# Altium footprint library kalios.PcbLib: 404 footprints (part 10 of 26) (continued)
## LOGO/EPFL/TOP+SMT/20x5.62mm [mm]
Top Layer:
  region: 6.452,2.327 6.445,2.793 6.452,2.88
  region: 6.452,2.327 6.452,2.88 6.481,2.013
  region: 6.481,2.013 6.452,2.88 6.481,3.294
  region: 6.481,2.013 6.481,3.294 6.492,1.896
  region: 6.492,1.896 6.481,3.294 6.492,3.363
  region: 6.492,1.896 6.492,3.363 6.56,1.502
  region: 6.56,1.502 6.492,3.363 6.56,3.788
  region: 6.56,1.502 6.56,3.788 6.566,1.481
  region: 6.566,1.481 6.56,3.788 6.566,3.826
  region: 6.566,1.481 6.566,3.826 6.707,0.975
  region: 6.707,0.975 6.566,3.826 6.707,4.388
  region: 6.707,0.975 6.707,4.388 6.746,0.835
  region: 6.746,0.835 6.707,4.388 6.746,4.501
  region: 6.746,0.835 6.746,4.501 6.912,0.437
  region: 6.912,0.437 6.746,4.501 6.912,4.979
  region: 6.912,0.437 6.912,4.979 6.953,0.34
  region: 6.953,0.34 6.912,4.979 6.953,5.069
  region: 6.953,0.34 6.953,5.069 7.084,0.098
  region: 7.084,0.098 6.953,5.069 7.084,5.361
  region: 7.084,0.098 7.084,2.498 7.089,0.09
  region: 7.089,0.09 7.084,2.498 7.089,2.287
  region: 7.084,2.498 7.084,5.361 7.089,2.498
  region: 7.089,2.498 7.084,5.361 7.089,5.372
  region: 7.089,0.09 7.089,2.287 7.112,0.046
  region: 7.112,0.046 7.089,2.287 7.112,2.107
  region: 7.089,2.498 7.089,5.372 7.112,2.498
  region: 7.112,2.498 7.089,5.372 7.112,5.424
  region: 7.112,0.046 7.112,2.107 7.12,0.031
  region: 7.12,0.031 7.112,2.107 7.12,2.046
  region: 7.112,2.498 7.112,3.086 7.12,2.498
  region: 7.12,2.498 7.112,3.086 7.12,3.086
  region: 7.112,3.086 7.112,5.424 7.12,3.174
  region: 7.12,3.174 7.112,5.424 7.12,5.442
  region: 7.12,0.031 7.12,2.046 7.153,-0.019
  region: 7.153,-0.019 7.12,2.046 7.153,1.793
  region: 7.12,2.498 7.12,3.086 7.153,2.498
  region: 7.153,2.498 7.12,3.086 7.153,3.086
  region: 7.12,3.174 7.12,5.442 7.153,3.543
  region: 7.153,3.543 7.12,5.442 7.153,5.516
  region: 7.153,-0.019 7.153,1.793 7.163,-0.034
  region: 7.163,-0.034 7.153,1.793 7.163,1.721
  region: 7.153,2.498 7.153,3.086 7.163,2.498
  region: 7.163,2.498 7.153,3.086 7.163,3.086
  region: 7.153,3.543 7.153,5.516 7.163,3.589
  region: 7.163,3.589 7.153,5.516 7.163,5.537
  region: 7.163,-0.034 7.163,1.721 7.189,-0.074
  region: 7.189,-0.074 7.163,1.721 7.189,1.609
  region: 7.163,2.498 7.163,3.086 7.189,2.498
  region: 7.189,2.498 7.163,3.086 7.189,3.086
  region: 7.163,3.589 7.163,5.537 7.189,3.719
  region: 7.189,3.719 7.163,5.537 7.189,5.596
  region: 7.189,-0.074 7.189,1.609 7.244,-0.074
  region: 7.244,-0.074 7.189,1.609 7.244,1.377
  region: 7.189,2.498 7.189,3.086 7.244,2.498
  region: 7.244,2.498 7.189,3.086 7.244,3.086
  region: 7.189,3.719 7.189,5.596 7.244,3.991
  region: 7.244,3.991 7.189,5.596 7.244,5.596
  region: 7.244,-0.074 7.244,1.377 7.254,-0.074
  region: 7.254,-0.074 7.244,1.377 7.254,1.336
  region: 7.244,2.498 7.244,3.086 7.254,2.498
  region: 7.254,2.498 7.244,3.086 7.254,3.086
  region: 7.244,3.991 7.244,5.596 7.254,4.021
  region: 7.254,4.021 7.244,5.596 7.254,5.596
  region: 7.254,-0.074 7.254,1.336 7.397,-0.074
  region: 7.397,-0.074 7.254,1.336 7.397,0.9
  region: 7.254,2.498 7.254,3.086 7.397,2.498
  region: 7.397,2.498 7.254,3.086 7.397,3.086
  region: 7.254,4.021 7.254,5.596 7.397,4.459
  region: 7.397,4.459 7.254,5.596 7.397,5.596
  region: 7.397,-0.074 7.397,0.9 7.507,-0.074
  region: 7.507,-0.074 7.397,0.9 7.507,0.645
  region: 7.397,2.498 7.397,3.086 7.507,2.498
  region: 7.507,2.498 7.397,3.086 7.507,3.086
  region: 7.397,4.459 7.397,5.596 7.507,4.797
  region: 7.507,4.797 7.397,5.596 7.507,5.596
  region: 7.507,-0.074 7.507,0.645 7.602,-0.074
  region: 7.602,-0.074 7.507,0.645 7.602,0.426
  region: 7.507,2.498 7.507,3.086 7.602,2.498
  region: 7.602,2.498 7.507,3.086 7.602,3.086
  region: 7.507,4.797 7.507,5.596 7.602,5
  region: 7.602,5 7.507,5.596 7.602,5.596
  region: 7.602,-0.074 7.602,0.426 7.797,-0.074
  region: 7.797,-0.074 7.602,0.426 7.797,0.076
  region: 7.602,2.498 7.602,3.086 7.797,2.498
  region: 7.797,2.498 7.602,3.086 7.797,3.086
  region: 7.602,5 7.602,5.596 7.797,5.417
  region: 7.797,5.417 7.602,5.596 7.797,5.596
  region: 7.797,-0.074 7.797,0.076 7.881,-0.074
  region: 7.797,5.417 7.797,5.596 7.881,5.596
  region: 0.076,-0.073 0.076,5.596 5.786,-0.073
  region: 5.786,-0.073 0.076,5.596 5.786,5.596
  region: 5.786,-0.073 5.786,2.794 5.792,-0.073
  region: 5.792,-0.073 5.786,2.794 5.792,2.327
  region: 5.786,2.794 5.786,5.596 5.792,2.879
  region: 5.792,2.879 5.786,5.596 5.792,5.596
  region: 5.792,-0.073 5.792,2.327 5.822,-0.073
  region: 5.822,-0.073 5.792,2.327 5.822,2.013
  region: 5.792,2.879 5.792,5.596 5.822,3.294
  region: 5.822,3.294 5.792,5.596 5.822,5.596
  region: 5.822,-0.073 5.822,2.013 5.833,-0.073
  region: 5.833,-0.073 5.822,2.013 5.833,1.896
  region: 5.822,3.294 5.822,5.596 5.833,3.364
  region: 5.833,3.364 5.822,5.596 5.833,5.596
  region: 5.833,-0.073 5.833,1.896 5.9,-0.073
  region: 5.9,-0.073 5.833,1.896 5.9,1.503
  region: 5.833,3.364 5.833,5.596 5.9,3.788
  region: 5.9,3.788 5.833,5.596 5.9,5.596
  region: 5.9,-0.073 5.9,1.503 5.906,-0.073
  region: 5.906,-0.073 5.9,1.503 5.906,1.481
  region: 5.9,3.788 5.9,5.596 5.906,3.827
  region: 5.906,3.827 5.9,5.596 5.906,5.596
  region: 5.906,-0.073 5.906,1.481 6.048,-0.073
  region: 6.048,-0.073 5.906,1.481 6.048,0.976
  region: 5.906,3.827 5.906,5.596 6.048,4.389
  region: 6.048,4.389 5.906,5.596 6.048,5.596
  region: 6.048,-0.073 6.048,0.976 6.087,-0.073
  region: 6.087,-0.073 6.048,0.976 6.087,0.836
  region: 6.048,4.389 6.048,5.596 6.087,4.502
  region: 6.087,4.502 6.048,5.596 6.087,5.596
  region: 6.087,-0.073 6.087,0.836 6.253,-0.073
  region: 6.253,-0.073 6.087,0.836 6.253,0.438
  region: 6.087,4.502 6.087,5.596 6.253,4.979
  region: 6.253,4.979 6.087,5.596 6.253,5.596
  region: 6.253,-0.073 6.253,0.438 6.293,-0.073
  region: 6.293,-0.073 6.253,0.438 6.293,0.341
  region: 6.253,4.979 6.253,5.596 6.293,5.069
  region: 6.293,5.069 6.253,5.596 6.293,5.596
  region: 6.293,-0.073 6.293,0.341 6.461,-0.073
  region: 6.461,-0.073 6.293,0.341 6.461,0.033
  region: 6.293,5.069 6.293,5.596 6.461,5.442
  region: 6.461,5.442 6.293,5.596 6.461,5.596
  region: 6.461,-0.073 6.461,0.033 6.529,-0.073
  region: 6.461,5.442 6.461,5.596 6.529,5.596
  region: 10.475,-0.075 10.472,2.757 10.475,2.8
  region: 10.475,-0.075 10.475,2.8 10.521,-0.075
  region: 10.521,-0.075 10.475,2.8 10.521,3.395
  region: 10.521,-0.075 10.521,3.395 10.651,-0.075
  region: 10.651,-0.075 10.521,3.395 10.651,4.082
  region: 10.651,-0.075 10.651,4.082 10.878,-0.075
  region: 10.878,-0.075 10.651,4.082 10.878,4.817
  region: 10.878,-0.075 10.878,4.817 11.128,-0.075
  region: 11.128,-0.075 10.878,4.817 11.128,5.391
  region: 11.128,2.497 11.128,5.391 11.139,2.497
  region: 11.139,2.497 11.128,5.391 11.139,5.417
  region: 11.139,2.497 11.139,3.085 11.18,2.497
  region: 11.18,2.497 11.139,3.085 11.18,3.085
  region: 11.139,3.085 11.139,5.417 11.18,3.542
  region: 11.18,3.542 11.139,5.417 11.18,5.512
  region: 11.18,2.497 11.18,3.085 11.217,2.497
  region: 11.217,2.497 11.18,3.085 11.217,3.085
  region: 11.18,3.542 11.18,5.512 11.217,3.721
  region: 11.217,3.721 11.18,5.512 11.217,5.595
  region: 11.217,2.497 11.217,3.085 11.271,2.497
  region: 11.271,2.497 11.217,3.085 11.271,3.085
  region: 11.217,3.721 11.217,5.595 11.271,3.99
  region: 11.271,3.99 11.217,5.595 11.271,5.595
  region: 11.271,2.497 11.271,3.085 11.534,2.497
  region: 11.534,2.497 11.271,3.085 11.534,3.085
  region: 11.271,3.99 11.271,5.595 11.534,4.796
  region: 11.534,4.796 11.271,5.595 11.534,5.595
  region: 11.534,2.497 11.534,3.085 11.825,2.497
  region: 11.825,2.497 11.534,3.085 11.825,3.085
  region: 11.534,4.796 11.534,5.595 11.825,5.416
  region: 11.825,5.416 11.534,5.595 11.825,5.595
  region: 11.825,5.416 11.825,5.595 11.908,5.595
  region: 12.237,2.132 12.217,5.596 12.237,5.596
  region: 12.237,2.132 12.237,5.596 12.317,1.575
  region: 12.317,1.575 12.237,5.596 12.317,5.596
  region: 12.317,1.575 12.317,5.596 12.435,1.09
  region: 12.435,1.09 12.317,5.596 12.435,5.596
  region: 12.435,1.09 12.435,5.596 12.574,0.683
  region: 12.574,0.683 12.435,5.596 12.574,5.596
  region: 12.574,0.683 12.574,5.596 12.715,0.358
  region: 12.715,0.358 12.574,5.596 12.715,5.596
  region: 12.715,0.358 12.715,5.596 12.839,0.12
  region: 12.839,0.12 12.715,5.596 12.839,5.596
  region: 12.839,0.12 12.839,5.596 12.853,0.098
  region: 12.853,0.098 12.839,5.596 12.853,5.596
  region: 12.853,0.098 12.853,5.596 12.856,0.093
  region: 12.856,0.093 12.853,5.596 12.856,2.497
  region: 12.856,0.093 12.856,2.497 12.861,0.085
  region: 12.861,0.085 12.856,2.497 12.861,2.286
  region: 12.861,0.085 12.861,2.286 12.934,-0.034
  region: 12.934,-0.034 12.861,2.286 12.934,1.72
  region: 12.934,-0.034 12.934,1.72 12.961,-0.076
  region: 12.961,-0.076 12.934,1.72 12.961,1.609
  region: 12.961,-0.076 12.961,1.609 13.026,-0.076
  region: 13.026,-0.076 12.961,1.609 13.026,1.334
  region: 13.026,-0.076 13.026,1.334 13.168,-0.076
  region: 13.168,-0.076 13.026,1.334 13.168,0.899
  region: 13.168,-0.076 13.168,0.899 13.374,-0.076
  region: 13.374,-0.076 13.168,0.899 13.374,0.424
  region: 13.374,-0.076 13.374,0.424 13.653,-0.076
  region: 13.526,2.286 13.518,5.596 13.526,5.596
  region: 13.526,2.286 13.526,5.596 13.6,1.72
  region: 13.6,1.72 13.526,5.596 13.6,5.596
  region: 13.6,1.72 13.6,5.596 13.691,1.334
  region: 13.691,1.334 13.6,5.596 13.691,5.596
  region: 13.691,1.334 13.691,5.596 13.834,0.899
  region: 13.834,0.899 13.691,5.596 13.834,5.596
  region: 13.834,0.899 13.834,5.596 14.039,0.424
  region: 14.039,0.424 13.834,5.596 14.039,5.596
  region: 14.039,0.424 14.039,5.596 14.318,-0.076
  region: 14.318,-0.076 14.039,5.596 14.318,5.596
  region: 14.318,-0.076 14.318,5.596 20.071,-0.075
  region: 20.071,-0.075 14.318,5.596 20.071,5.596
  region: 20.071,-0.075 20.071,5.596 20.076,5.596
  region: 8.309,-0.075 8.309,5.596 8.952,-0.075
  region: 8.952,-0.075 8.309,5.596 8.952,5.596
  region: 9.285,2.757 9.134,2.757 9.285,2.985
  region: 9.285,5.353 9.134,5.596 9.285,5.596
  region: 9.285,2.757 9.285,2.985 9.311,2.757
  region: 9.311,2.757 9.285,2.985 9.311,3.024
  region: 9.285,5.353 9.285,5.596 9.311,5.298
  region: 9.311,5.298 9.285,5.596 9.311,5.596
  region: 9.311,2.757 9.311,3.024 9.418,2.757
  region: 9.418,2.757 9.311,3.024 9.418,3.238
  region: 9.311,5.298 9.311,5.596 9.418,5.074
  region: 9.418,5.074 9.311,5.596 9.418,5.596
  region: 9.418,2.757 9.418,3.238 9.443,2.757
  region: 9.443,2.757 9.418,3.238 9.443,3.288
  region: 9.418,5.074 9.418,5.596 9.443,5.006
  region: 9.443,5.006 9.418,5.596 9.443,5.596
  region: 9.443,2.757 9.443,3.288 9.482,2.757
  region: 9.482,2.757 9.443,3.288 9.482,3.399
  region: 9.443,5.006 9.443,5.596 9.482,4.902
  region: 9.482,4.902 9.443,5.596 9.482,5.596
  region: 9.482,2.757 9.482,3.399 9.534,2.757
  region: 9.534,2.757 9.482,3.399 9.534,3.549
  region: 9.482,4.902 9.482,5.596 9.534,4.725
  region: 9.534,4.725 9.482,5.596 9.534,5.596
  region: 9.534,2.757 9.534,3.549 9.538,2.757
  region: 9.538,2.757 9.534,3.549 9.538,3.567
  region: 9.534,4.725 9.534,5.596 9.538,4.711
  region: 9.538,4.711 9.534,5.596 9.538,5.596
  region: 9.538,2.757 9.538,3.567 9.581,2.757
  region: 9.581,2.757 9.538,3.567 9.581,3.769
  region: 9.538,4.711 9.538,5.596 9.581,4.504
  region: 9.581,4.504 9.538,5.596 9.581,5.596
  region: 9.581,2.757 9.581,3.769 9.588,2.757
  region: 9.588,2.757 9.581,3.769 9.588,3.802
  region: 9.581,4.504 9.581,5.596 9.588,4.443
  region: 9.588,4.443 9.581,5.596 9.588,5.596
  region: 9.588,2.757 9.588,3.802 9.607,2.757
  region: 9.607,2.757 9.588,3.802 9.607,4.005
  region: 9.588,4.443 9.588,5.596 9.607,4.282
  region: 9.607,4.282 9.588,5.596 9.607,5.596
  region: 9.607,2.757 9.607,4.005 9.611,2.757
  region: 9.611,2.757 9.607,4.005 9.611,4.047
  region: 9.607,4.282 9.607,5.596 9.611,4.047
  region: 9.611,4.047 9.607,5.596 9.611,5.596
  region: 9.611,2.757 9.611,5.596 9.819,2.757
  region: 9.819,2.757 9.611,5.596 9.819,5.596
  region: 9.819,2.757 9.819,5.596 9.861,2.817
  region: 9.861,2.817 9.819,5.596 9.861,5.526
  region: 9.861,2.817 9.861,5.526 9.962,2.99
  region: 9.962,2.99 9.861,5.526 9.962,5.358
  region: 9.962,2.99 9.962,5.358 9.986,3.043
  region: 9.986,3.043 9.962,5.358 9.986,5.317
  region: 9.986,3.043 9.986,5.317 10.087,3.26
  region: 10.087,3.26 9.986,5.317 10.087,5.096
  region: 10.087,3.26 10.087,5.096 10.11,3.335
  region: 10.11,3.335 10.087,5.096 10.11,5.044
  region: 10.11,3.335 10.11,5.044 10.196,3.603
  region: 10.196,3.603 10.11,5.044 10.196,4.778
  region: 10.196,3.603 10.196,4.778 10.199,3.615
  region: 10.199,3.615 10.196,4.778 10.199,4.76
  region: 10.199,3.615 10.199,4.76 10.24,3.819
  region: 10.24,3.819 10.199,4.76 10.24,4.554
  region: 10.24,3.819 10.24,4.554 10.247,3.879
  region: 10.247,3.879 10.24,4.554 10.247,4.52
  region: 10.247,3.879 10.247,4.52 10.265,4.039
  region: 10.265,4.039 10.247,4.52 10.265,4.315
  region: 10.265,4.039 10.265,4.315 10.269,4.274
Top Overlay:
  drawing of 274 lines, arcs and shapes, not listed
Top Designator:
  text ".Designator" at 2.459,2.252 h1.52

## LOGO/HEIG-VD [mm]
Top Layer:
  drawing of 7 lines, arcs and shapes, not listed
Top Designator:
  text ".Designator" at 6.566,-11.185 h1.52

## LOGO/HIGH VOLTAGE/17.5x15mm [mm]
Top Layer:
  region: -0.047,0.639 -0.051,0.654 -0.047,0.779
  region: -0.047,0.639 -0.047,0.779 -0.022,0.544
  region: -0.022,0.544 -0.047,0.779 -0.022,0.904
  region: -0.022,0.544 -0.022,0.904 0.02,0.386
  region: 0.02,0.386 -0.022,0.904 0.02,1.029
  region: 0.02,0.386 0.02,1.029 0.032,0.339
  region: 0.032,0.339 0.02,1.029 0.032,1.056
  region: 0.032,0.339 0.032,1.056 0.076,0.291
  region: 0.076,0.291 0.032,1.056 0.076,1.152
  region: 0.076,0.291 0.076,1.152 0.223,0.125
  region: 0.223,0.125 0.076,1.152 0.223,1.402
  region: 0.223,0.125 0.223,1.402 0.502,-0.007
  region: 0.502,-0.007 0.223,1.402 0.502,1.874
  region: 0.502,-0.007 0.502,1.874 0.849,-0.075
  region: 0.849,-0.075 0.502,1.874 0.849,2.461
  region: 0.849,-0.075 0.849,2.461 1.244,-0.097
  region: 1.244,-0.097 0.849,2.461 1.244,3.13
  region: 1.244,-0.097 1.244,3.13 1.381,-0.097
  region: 1.381,-0.097 1.244,3.13 1.381,3.362
  region: 1.381,-0.097 1.381,1.084 1.385,-0.097
  region: 1.385,-0.097 1.381,1.084 1.385,1.043
  region: 1.381,1.084 1.381,3.362 1.385,1.105
  region: 1.385,1.105 1.381,3.362 1.385,3.368
  region: 1.385,-0.097 1.385,1.043 1.389,-0.097
  region: 1.389,-0.097 1.385,1.043 1.389,1.043
  region: 1.385,1.105 1.385,3.368 1.389,1.129
  region: 1.389,1.129 1.385,3.368 1.389,3.375
  region: 1.389,-0.097 1.389,1.043 1.405,-0.097
  region: 1.405,-0.097 1.389,1.043 1.405,1.043
  region: 1.389,1.129 1.389,3.375 1.405,1.177
  region: 1.405,1.177 1.389,3.375 1.405,3.402
  region: 1.405,-0.097 1.405,1.043 1.428,-0.097
  region: 1.428,-0.097 1.405,1.043 1.428,1.043
  region: 1.405,1.177 1.405,3.402 1.428,1.228
  region: 1.428,1.228 1.405,3.402 1.428,3.441
  region: 1.428,-0.097 1.428,1.043 6.84,-0.083
  region: 6.84,-0.083 1.428,1.043 6.84,1.051
  region: 1.428,1.228 1.428,3.441 6.84,10.333
  region: 6.84,10.333 1.428,3.441 6.84,12.605
  region: 6.84,-0.083 6.84,1.051 7.894,-0.08
  region: 7.894,-0.08 6.84,1.051 7.894,1.052
  region: 6.84,10.333 6.84,12.605 7.894,12.098
  region: 7.894,12.098 6.84,12.605 7.894,14.389
  region: 7.894,-0.08 7.894,1.052 7.987,-0.08
  region: 7.987,-0.08 7.894,1.052 7.987,1.052
  region: 7.894,12.098 7.894,14.389 7.987,12.253
  region: 7.987,12.253 7.894,14.389 7.987,14.528
  region: 7.987,-0.08 7.987,1.052 8.091,-0.08
  region: 8.091,-0.08 7.987,1.052 8.091,1.053
  region: 7.987,12.253 7.987,14.528 8.091,12.428
  region: 8.091,12.428 7.987,14.528 8.091,14.65
  region: 8.091,-0.08 8.091,1.053 8.214,-0.079
  region: 8.214,-0.079 8.091,1.053 8.214,1.053
  region: 8.091,12.428 8.091,14.65 8.214,12.634
  region: 8.214,12.634 8.091,14.65 8.214,14.752
  region: 8.214,-0.079 8.214,1.053 8.362,-0.079
  region: 8.362,-0.079 8.214,1.053 8.362,1.053
  region: 8.214,12.634 8.214,14.752 8.362,12.882
  region: 8.362,12.882 8.214,14.752 8.362,14.832
  region: 8.362,-0.079 8.362,1.053 8.542,-0.078
  region: 8.542,-0.078 8.362,1.053 8.542,1.053
  region: 8.362,12.882 8.362,14.832 8.542,13.183
  region: 8.542,13.183 8.362,14.832 8.542,14.886
  region: 8.542,-0.078 8.542,1.053 8.726,-0.078
  region: 8.726,-0.078 8.542,1.053 8.726,1.053
  region: 8.542,13.183 8.542,14.886 8.726,13.491
  region: 8.726,13.491 8.542,14.886 8.726,14.899
  region: 8.726,-0.078 8.726,1.053 8.774,-0.078
  region: 8.774,-0.078 8.726,1.053 8.774,1.053
  region: 8.726,13.491 8.726,14.899 8.774,13.413
  region: 8.774,13.413 8.726,14.899 8.774,14.903
  region: 8.774,-0.078 8.774,1.053 8.972,-0.077
  region: 8.972,-0.077 8.774,1.053 8.972,1.054
  region: 8.774,13.413 8.774,14.903 8.972,13.083
  region: 8.972,13.083 8.774,14.903 8.972,14.868
  region: 8.972,-0.077 8.972,1.054 9.141,-0.077
  region: 9.141,-0.077 8.972,1.054 9.141,1.054
  region: 8.972,13.083 8.972,14.868 9.141,12.801
  region: 9.141,12.801 8.972,14.868 9.141,14.79
  region: 9.141,-0.077 9.141,1.054 9.286,-0.077
  region: 9.286,-0.077 9.141,1.054 9.286,1.054
  region: 9.141,12.801 9.141,14.79 9.286,12.56
  region: 9.286,12.56 9.141,14.79 9.286,14.677
  region: 9.286,-0.077 9.286,1.054 9.411,-0.076
  region: 9.411,-0.076 9.286,1.054 9.411,1.054
  region: 9.286,12.56 9.286,14.677 9.411,12.352
  region: 9.411,12.352 9.286,14.677 9.411,14.537
  region: 9.411,-0.076 9.411,1.054 9.52,-0.076
  region: 9.52,-0.076 9.411,1.054 9.52,1.054
  region: 9.411,12.352 9.411,14.537 9.52,12.17
  region: 9.52,12.17 9.411,14.537 9.52,14.38
  region: 9.52,-0.076 9.52,1.054 16.191,-0.059
  region: 16.191,-0.059 9.52,1.054 16.191,1.064
  region: 9.52,12.17 9.52,14.38 16.191,1.064
  region: 16.191,1.064 9.52,14.38 16.191,3.239
  region: 16.191,-0.059 16.191,3.239 16.692,-0.057
  region: 16.692,-0.057 16.191,3.239 16.692,2.403
  region: 16.692,-0.057 16.692,2.403 16.943,-0.034
  region: 16.943,-0.034 16.692,2.403 16.943,1.984
  region: 16.943,-0.034 16.943,1.984 17.15,0.01
  region: 17.15,0.01 16.943,1.984 17.15,1.638
  region: 17.15,0.01 17.15,1.638 17.299,0.079
  region: 17.299,0.079 17.15,1.638 17.299,1.389
  region: 17.299,0.079 17.299,1.389 17.35,0.124
  region: 17.35,0.124 17.299,1.389 17.35,1.303
  region: 17.35,0.124 17.35,1.303 17.397,0.18
  region: 17.397,0.18 17.35,1.303 17.397,1.225
  region: 17.397,0.18 17.397,1.225 17.44,0.244
  region: 17.44,0.244 17.397,1.225 17.44,1.153
  region: 17.44,0.244 17.44,1.153 17.455,0.273
  region: 17.455,0.273 17.44,1.153 17.455,1.127
  region: 17.455,0.273 17.455,1.127 17.478,0.314
  region: 17.478,0.314 17.455,1.127 17.478,1.073
  region: 17.478,0.314 17.478,1.073 17.508,0.386
  region: 17.508,0.386 17.478,1.073 17.508,0.998
  region: 17.508,0.386 17.508,0.998 17.509,0.389
  region: 17.509,0.389 17.508,0.998 17.509,0.995
  region: 17.509,0.389 17.509,0.995 17.535,0.465
  region: 17.535,0.465 17.509,0.995 17.535,0.909
  region: 17.535,0.465 17.535,0.909 17.547,0.513
  region: 17.547,0.513 17.535,0.909 17.547,0.869
  region: 17.547,0.513 17.547,0.869 17.554,0.54
  region: 17.554,0.54 17.547,0.869 17.554,0.825
  region: 17.554,0.54 17.554,0.825 17.565,0.613
  region: 17.565,0.613 17.554,0.825 17.565,0.754
  region: 17.565,0.613 17.565,0.754 17.567,0.74
  region: 7.3,5.624 6.553,5.247 7.3,8.094
  region: 7.3,5.624 7.3,8.094 7.968,5.961
  region: 7.968,5.961 7.3,8.094 7.968,10.427
  region: 8.098,3.219 7.968,3.832 8.098,3.762
  region: 7.968,5.961 7.968,10.427 8.098,6.027
  region: 8.098,6.027 7.968,10.427 8.098,10.883
  region: 8.098,3.219 8.098,3.762 8.111,3.159
  region: 8.111,3.159 8.098,3.762 8.111,3.747
  region: 8.098,6.027 8.098,10.883 8.111,6.033
  region: 8.111,6.033 8.098,10.883 8.111,10.928
  region: 8.111,3.159 8.111,3.747 8.214,2.677
  region: 8.214,2.677 8.111,3.747 8.214,3.63
  region: 8.111,6.033 8.111,10.928 8.214,6.085
  region: 8.214,6.085 8.111,10.928 8.214,10.928
  region: 8.214,2.677 8.214,3.63 8.234,2.581
  region: 8.234,2.581 8.214,3.63 8.234,3.607
  region: 8.214,6.085 8.214,6.888 8.234,6.095
  region: 8.234,6.095 8.214,6.888 8.234,6.898
  region: 8.214,6.888 8.214,10.928 8.234,6.939
  region: 8.234,6.939 8.214,10.928 8.234,10.928
  region: 8.234,2.581 8.234,3.607 8.501,1.33
  region: 8.501,1.33 8.234,3.607 8.501,3.319
  region: 8.234,6.095 8.234,6.898 8.501,6.23
  region: 8.501,6.23 8.234,6.898 8.501,7.035
  region: 8.234,6.939 8.234,10.928 8.501,7.6
  region: 8.501,7.6 8.234,10.928 8.501,10.928
  region: 8.501,1.33 8.501,3.319 8.993,2.029
  region: 8.993,2.029 8.501,3.319 8.993,6.478
  region: 8.501,6.23 8.501,7.035 8.993,6.478
  region: 8.993,6.478 8.501,7.035 8.993,7.288
  region: 8.501,7.6 8.501,10.928 8.993,8.82
  region: 8.993,8.82 8.501,10.928 8.993,10.928
  region: 8.993,2.029 8.993,7.288 9.036,2.09
  region: 9.036,2.09 8.993,7.288 9.036,7.31
  region: 8.993,8.82 8.993,10.928 9.036,8.926
  region: 9.036,8.926 8.993,10.928 9.036,10.928
  region: 9.036,2.09 9.036,7.31 9.234,2.371
  region: 9.234,2.371 9.036,7.31 9.234,7.411
  region: 9.036,8.926 9.036,10.928 9.234,9.387
  region: 9.234,9.387 9.036,10.928 9.234,10.928
  region: 9.234,2.371 9.234,7.411 9.239,2.379
  region: 9.239,2.379 9.234,7.411 9.239,7.414
  region: 9.234,9.387 9.234,10.928 9.239,9.399
  region: 9.239,9.399 9.234,10.928 9.239,10.928
  region: 9.239,2.379 9.239,3.176 9.896,3.38
  region: 9.896,3.38 9.239,3.176 9.896,3.427
  region: 9.239,3.176 9.239,7.414 9.896,5.666
  region: 9.896,5.666 9.239,7.414 9.896,7.751
  region: 9.239,9.399 9.239,10.928 9.896,10.928
  region: 9.896,3.38 9.896,3.427 9.936,3.442
  region: 9.896,5.666 9.896,7.751 9.936,5.82
  region: 9.936,5.82 9.896,7.751 9.936,7.772
  region: 9.936,5.82 9.936,7.772 10.531,8.077
Top Overlay:
  drawing of 179 lines, arcs and shapes, not listed
Top Designator:
  text ".Designator" at 1.141,6.895 h1.52

## LQFP32 [mm] "TQFP, 32-Leads, Body 9.0x9.0mm (max), Pitch 0.80mm, IPC Medium Density"
height 1.6
pads (32):
  oval 1.6x0.55 smd: 1(-4.15,2.8) 2(-4.15,2) 3(-4.15,1.2) 4(-4.15,0.4) 5(-4.15,-0.4) 6(-4.15,-1.2) 7(-4.15,-2) 8(-4.15,-2.8) 17(4.15,-2.8) 18(4.15,-2) 19(4.15,-1.2) 20(4.15,-0.4) 21(4.15,0.4) 22(4.15,1.2) 23(4.15,2) 24(4.15,2.8)
  oval 0.55x1.6 smd: 9(-2.8,-4.15) 10(-2,-4.15) 11(-1.2,-4.15) 12(-0.4,-4.15) 13(0.4,-4.15) 14(1.2,-4.15) 15(2,-4.15) 16(2.8,-4.15) 25(2.8,4.15) 26(2,4.15) 27(1.2,4.15) 28(0.4,4.15) 29(-0.4,4.15) 30(-1.2,4.15) 31(-2,4.15) 32(-2.8,4.15)
Top Overlay:
  circle w0.6: c-1.95,1.95 r0.3
  circle w0.25: c-4.15,3.625 r0.125
  lines w0.2: -2.95,-2.95 2.95,-2.95 2.95,2.95 -2.95,2.95 -2.95,-2.95
Top 3D Body:
  circle w0.1: c-2.55,2.55 r0.5
  lines w0.15: -3.5,-3.5 3.5,-3.5 3.5,3.5 -3.5,3.5 -3.5,-3.5
  lines w0.2: -4.216,-2.946 -4.216,-2.642 ; -4.216,1.041 -4.216,1.346 ; -4.216,1.854 -4.216,2.159 ; -4.216,2.642 -4.216,2.946 ; -4.191,-2.159 -4.191,-1.854 ; -4.191,-1.346 -4.191,-1.041 ; -4.191,-0.533 -4.191,-0.229 ; -4.191,0.254 -4.191,0.559 ; -3.581,-2.972 -4.547,-2.972 -4.547,-2.616 -3.581,-2.616 ; -3.581,1.016 -4.547,1.016 -4.547,1.372 -3.581,1.372 ; -3.581,1.829 -4.547,1.829 -4.547,2.184 -3.581,2.184 ; -3.581,2.616 -4.547,2.616 -4.547,2.972 -3.581,2.972 ; -3.556,-2.184 -4.521,-2.184 -4.521,-1.829 -3.556,-1.829 ; -3.556,-1.372 -4.521,-1.372 -4.521,-1.016 -3.556,-1.016 ; -3.556,-0.559 -4.521,-0.559 -4.521,-0.203 -3.556,-0.203 ; -3.556,0.229 -4.521,0.229 -4.521,0.584 -3.556,0.584 ; -2.972,-3.556 -2.972,-4.521 -2.616,-4.521 -2.616,-3.556 ; -2.972,3.556 -2.972,4.521 -2.616,4.521 -2.616,3.556 ; -2.946,-4.191 -2.642,-4.191 ; -2.946,4.191 -2.642,4.191 ; -2.184,-3.556 -2.184,-4.521 -1.829,-4.521 -1.829,-3.556 ; -2.184,3.531 -2.184,4.496 -1.829,4.496 -1.829,3.531 ; -2.159,-4.191 -1.854,-4.191 ; -2.159,4.166 -1.854,4.166 ; -1.372,-3.556 -1.372,-4.521 -1.016,-4.521 -1.016,-3.556 ; -1.372,3.531 -1.372,4.496 -1.016,4.496 -1.016,3.531 ; -1.346,-4.191 -1.041,-4.191 ; -1.346,4.166 -1.041,4.166 ; -0.584,-3.531 -0.584,-4.496 -0.229,-4.496 -0.229,-3.531 ; -0.559,-4.166 -0.254,-4.166 ; -0.559,3.531 -0.559,4.496 -0.203,4.496 -0.203,3.531 ; -0.533,4.166 -0.229,4.166 ; 0.203,-3.531 0.203,-4.496 0.559,-4.496 0.559,-3.531 ; 0.229,-4.166 0.533,-4.166 ; 0.229,3.531 0.229,4.496 0.584,4.496 0.584,3.531 ; 0.254,4.166 0.559,4.166 ; 1.016,-3.531 1.016,-4.496 1.372,-4.496 1.372,-3.531 ; 1.016,3.556 1.016,4.521 1.372,4.521 1.372,3.556 ; 1.041,-4.166 1.346,-4.166 ; 1.041,4.191 1.346,4.191 ; 1.829,-3.531 1.829,-4.496 2.184,-4.496 2.184,-3.531 ; 1.829,3.556 1.829,4.521 2.184,4.521 2.184,3.556 ; 1.854,-4.166 2.159,-4.166 ; 1.854,4.191 2.159,4.191 ; 2.616,-3.556 2.616,-4.521 2.972,-4.521 2.972,-3.556 ; 2.616,3.556 2.616,4.521 2.972,4.521 2.972,3.556 ; 2.642,-4.191 2.946,-4.191 ; 2.642,4.191 2.946,4.191 ; 3.505,-0.584 4.47,-0.584 4.47,-0.229 3.505,-0.229 ; 3.505,0.203 4.47,0.203 4.47,0.559 3.505,0.559 ; 3.505,1.016 4.47,1.016 4.47,1.372 3.505,1.372 ; 3.505,1.829 4.47,1.829 4.47,2.184 3.505,2.184 ; 3.531,-2.972 4.496,-2.972 4.496,-2.616 3.531,-2.616 ; 3.531,-2.184 4.496,-2.184 4.496,-1.829 3.531,-1.829 ; 3.531,-1.372 4.496,-1.372 4.496,-1.016 3.531,-1.016 ; 3.531,2.616 4.496,2.616 4.496,2.972 3.531,2.972 ; 4.14,-0.559 4.14,-0.254 ; 4.14,0.229 4.14,0.533 ; 4.14,1.041 4.14,1.346 ; 4.14,1.854 4.14,2.159 ; 4.166,-2.946 4.166,-2.642 ; 4.166,-2.159 4.166,-1.854 ; 4.166,-1.346 4.166,-1.041 ; 4.166,2.642 4.166,2.946
Top Courtyard:
  lines w0.1: -0.5,0 0.5,0 ; 0,-0.5 0,0.5 ; -5.2,-5.2 5.2,-5.2 5.2,5.2 -5.2,5.2 -5.2,-5.2
Top Designator:
  text ".Designator" at -7.618,-0.508 h1.52
3D body "User Library-lqfp32-1.STEP": height 1.5, standoff 0.02, extent -4.5,-4.5 4.5,4.5

## LQFP48 [mm] "TSQFP, 48-Leads, Body 9.0x9.0mm (max), Pitch 0.50mm, IPC Medium Density"
height 1.6
pads (48):
  oval 1.85x0.35 smd: 1(-3.975,2.75) 2(-3.975,2.25) 3(-3.975,1.75) 4(-3.975,1.25) 5(-3.975,0.75) 6(-3.975,0.25) 7(-3.975,-0.25) 8(-3.975,-0.75) 9(-3.975,-1.25) 10(-3.975,-1.75) 11(-3.975,-2.25) 12(-3.975,-2.75) 25(3.975,-2.75) 26(3.975,-2.25) 27(3.975,-1.75) 28(3.975,-1.25) 29(3.975,-0.75) 30(3.975,-0.25) 31(3.975,0.25) 32(3.975,0.75) 33(3.975,1.25) 34(3.975,1.75) 35(3.975,2.25) 36(3.975,2.75)
  oval 0.35x1.85 smd: 13(-2.75,-3.975) 14(-2.25,-3.975) 15(-1.75,-3.975) 16(-1.25,-3.975) 17(-0.75,-3.975) 18(-0.25,-3.975) 19(0.25,-3.975) 20(0.75,-3.975) 21(1.25,-3.975) 22(1.75,-3.975) 23(2.25,-3.975) 24(2.75,-3.975) 37(2.75,3.975) 38(2.25,3.975) 39(1.75,3.975) 40(1.25,3.975) 41(0.75,3.975) 42(0.25,3.975) 43(-0.25,3.975) 44(-0.75,3.975) 45(-1.25,3.975) 46(-1.75,3.975) 47(-2.25,3.975) 48(-2.75,3.975)
Top Overlay:
  circle w0.6: c-1.65,1.65 r0.3
  circle w0.25: c-3.975,3.475 r0.125
  lines w0.2: -2.65,-2.65 2.65,-2.65 2.65,2.65 -2.65,2.65 -2.65,-2.65
Top 3D Body:
  circle w0.1: c-2.55,2.55 r0.5
  lines w0.1: -3.5,-3.5 3.5,-3.5 3.5,3.5 -3.5,3.5 -3.5,-3.5
Top Courtyard:
  lines w0.1: -0.5,0 0.5,0 ; 0,-0.5 0,0.5 ; -5.15,-5.15 5.15,-5.15 5.15,5.15 -5.15,5.15 -5.15,-5.15
Top Designator:
  text ".Designator" at -7.618,-0.508 h1.52
3D body "User Library-LQFP48.STEP": height 1.5, standoff 0, extent -4.5,-4.5 4.5,4.5